# Altium footprint library Connectors THD.PcbLib: 631 footprints (part 8 of 46) (continued)
## AXON_ND2A225SCBRPG1 [mm] "AXON Nano-D 2 Row Right Angle PCB Receptacle With Threaded Hole #0-80 UNF" (continued)
Mechanical 14:
  circle w0.3: c-5.408,0.478 r0.15
  circle w0.1: c5.969,-1.448 r0.596
  circle w0.1: c-5.968,-1.448 r0.596
  circle w0.1: c-5.968,-3.178 r0.35
  circle w0.1: c-5.968,-3.178 r0.175
  circle w0.1: c5.969,-3.178 r0.35
  circle w0.1: c5.969,-3.178 r0.175
  lines w0.1: -4.699,-3.148 -4.699,2.662 ; -4.699,-0.128 -7.304,-0.128 -7.304,-8.868 7.306,-8.868 7.306,-0.128 4.701,-0.128 ; 4.706,-3.148 4.701,2.662 ; -4.699,2.662 4.701,2.662 ; -4.699,2.662 -4.704,-3.148 4.701,-3.148 4.701,2.662 ; -4.699,2.662 4.701,2.662
3D body: height 3.56, standoff -2.77, extent -7.304,-8.868 7.306,2.662

## BELFUSE_0826-1G1T-43-F [mm] "1 Port, Green/Green LEDs, RJ45 10/100/1000 Gigabit Ethernet, MagJack Connector Module"
height 13.61
pads (20):
  round 1.6 hole 0.9: 1(-5.08,1.27) 2(-3.048,1.27) 3(-1.016,1.27) 4(1.016,1.27) 5(3.048,1.27) 6(5.08,1.27) 7(-6.096,-1.27) 8(-4.064,-1.27) 9(-2.032,-1.27) 10(2.032,-1.27) 11(4.064,-1.27) 12(6.096,-1.27)
  round 1.8 hole 1.1: 13(-6.096,-3.81) 14(-3.556,-3.81) 15(3.556,-3.81) 16(6.096,-3.81)
  round 2.3 hole 1.6: 17(-8.065,19.685) 18(8.065,19.685)
  round 1 hole 3.2 unplated mask+1.1: 19(-6.35,16.51) 20(6.35,16.51)
Top Overlay:
  lines w0.2: -8.924,20.975 cw(c3.316,22.785) -8.15,27.435 ; -8.642,21.124 cw(c3.316,22.785) -8.15,26.565 ; -8.15,15.638 -8.15,-2.765 -7.95,-2.765 ; -8.15,17.382 -8.15,18.137 ; -8.15,21.233 -8.15,27.435 ; -7.325,-4.465 -7.95,-4.465 -7.95,-2.765 ; -7.325,-2.765 -7.95,-2.765 ; -6.826,-5.065 -2.826,-5.065 ; -6.5,27.435 cw(c-6,27.435) -6,27.935 -4.5,27.935 cw(c-4.5,27.435) -4,27.435 ; -6.3,27.435 -6.12,20.222 ccw(c-4.8,20.222) -3.48,20.222 -3.3,27.435 ; -5.8,27.435 -5.619,20.222 ccw(c-4.8,20.222) -3.981,20.201 -3.8,27.435 ; -2.4,-4.465 2.4,-4.465 ; -2.4,-2.765 2.4,-2.765 ; 2.826,-5.065 6.826,-5.065 ; 3.3,27.435 3.48,20.222 ccw(c4.8,20.222) 6.12,20.222 6.3,27.435 ; 3.8,27.435 3.981,20.201 ccw(c4.8,20.222) 5.619,20.222 5.8,27.435 ; 4,27.435 cw(c4.5,27.435) 4.5,27.935 6,27.935 cw(c6,27.435) 6.5,27.435 ; 7.325,-4.465 7.95,-4.465 7.95,-2.765 ; 7.325,-2.765 7.95,-2.765 ; 8.15,15.638 8.15,-2.765 7.95,-2.765 ; 8.15,17.382 8.15,18.137 ; 8.15,21.233 8.15,27.435 ; 8.15,26.565 cw(c-3.316,22.785) 8.642,21.124 ; 8.924,20.975 ccw(c-3.316,22.785) 8.15,27.435 ; -8.15,27.435 8.15,27.435
Mechanical 8:
  circle w0.1: c6.096,-1.27 r0.45
  circle w0.1: c-6.096,-1.27 r0.45
  circle w0.1: c6.096,-3.81 r0.55
  circle w0.1: c-6.096,-3.81 r0.55
  circle w0.1: c-5.08,1.27 r0.45
  circle w0.1: c5.08,1.27 r0.45
  circle w0.1: c6.35,16.51 r1.6
  circle w0.1: c-6.35,16.51 r1.6
  circle w0.1: c-8.065,19.685 r0.8
  circle w0.1: c8.065,19.685 r0.8
  lines w0.1: -8.565,19.685 -8.065,19.685 ; -8.065,19.185 -8.065,19.685 ; -8.065,20.185 -8.065,19.685 ; -7.565,19.685 -8.065,19.685 ; -6.85,16.51 -6.35,16.51 ; -6.596,-3.81 -6.096,-3.81 ; -6.596,-1.27 -6.096,-1.27 ; -6.35,16.01 -6.35,16.51 ; -6.35,17.01 -6.35,16.51 ; -6.096,-4.31 -6.096,-3.81 ; -6.096,-3.31 -6.096,-3.81 ; -6.096,-1.77 -6.096,-1.27 ; -6.096,-0.77 -6.096,-1.27 ; -5.85,16.51 -6.35,16.51 ; -5.596,-3.81 -6.096,-3.81 ; -5.596,-1.27 -6.096,-1.27 ; -5.58,1.27 -5.08,1.27 ; -5.08,0.77 -5.08,1.27 ; -5.08,1.77 -5.08,1.27 ; -4.58,1.27 -5.08,1.27 ; -4.564,-1.27 -4.064,-1.27 ; -4.064,-1.77 -4.064,-1.27 ; -4.064,-0.77 -4.064,-1.27 ; -4.056,-3.81 -3.556,-3.81 ; -3.564,-1.27 -4.064,-1.27 ; -3.556,-4.31 -3.556,-3.81 ; -3.556,-3.31 -3.556,-3.81 ; -3.548,1.27 -3.048,1.27 ; -3.056,-3.81 -3.556,-3.81 ; -3.048,0.77 -3.048,1.27 ; -3.048,1.77 -3.048,1.27 ; -2.548,1.27 -3.048,1.27 ; -2.532,-1.27 -2.032,-1.27 ; -2.032,-1.77 -2.032,-1.27 ; -2.032,-0.77 -2.032,-1.27 ; -1.532,-1.27 -2.032,-1.27 ; -1.516,1.27 -1.016,1.27 ; -1.016,0.77 -1.016,1.27 ; -1.016,1.77 -1.016,1.27 ; -0.516,1.27 -1.016,1.27 ; -0.5,0 0,0 ; 0,-0.5 0,0 ; 0,0.5 0,0 ; 0.5,0 0,0 ; 0.516,1.27 1.016,1.27 ; 1.016,0.77 1.016,1.27 ; 1.016,1.77 1.016,1.27 ; 1.516,1.27 1.016,1.27 ; 1.532,-1.27 2.032,-1.27 ; 2.032,-1.77 2.032,-1.27 ; 2.032,-0.77 2.032,-1.27 ; 2.532,-1.27 2.032,-1.27 ; 2.548,1.27 3.048,1.27 ; 3.048,0.77 3.048,1.27 ; 3.048,1.77 3.048,1.27 ; 3.056,-3.81 3.556,-3.81 ; 3.548,1.27 3.048,1.27 ; 3.556,-4.31 3.556,-3.81 ; 3.556,-3.31 3.556,-3.81 ; 3.564,-1.27 4.064,-1.27 ; 4.056,-3.81 3.556,-3.81 ; 4.064,-1.77 4.064,-1.27 ; 4.064,-0.77 4.064,-1.27 ; 4.564,-1.27 4.064,-1.27 ; 4.58,1.27 5.08,1.27 ; 5.08,0.77 5.08,1.27 ; 5.08,1.77 5.08,1.27 ; 5.58,1.27 5.08,1.27 ; 5.596,-3.81 6.096,-3.81 ; 5.596,-1.27 6.096,-1.27 ; 5.85,16.51 6.35,16.51 ; 6.096,-4.31 6.096,-3.81 ; 6.096,-3.31 6.096,-3.81 ; 6.096,-1.77 6.096,-1.27 ; 6.096,-0.77 6.096,-1.27 ; 6.35,16.01 6.35,16.51 ; 6.35,17.01 6.35,16.51 ; 6.596,-3.81 6.096,-3.81 ; 6.596,-1.27 6.096,-1.27 ; 6.85,16.51 6.35,16.51 ; 7.565,19.685 8.065,19.685 ; 8.065,19.185 8.065,19.685 ; 8.065,20.185 8.065,19.685 ; 8.565,19.685 8.065,19.685
Mechanical 14:
  lines w0.1: -8.15,26.565 ccw(c3.316,22.785) -8.306,19.516 -8.595,19.435 cw(c3.316,22.785) -8.15,27.435 ; -7.95,-2.765 -7.95,-4.465 -6.826,-4.465 ; -6.826,-2.765 -6.826,-5.065 -2.826,-5.065 -2.826,-2.765 ; -6.5,27.435 cw(c-6,27.435) -6,27.935 -4.5,27.935 cw(c-4.5,27.435) -4,27.435 ; -6.3,27.435 -6.12,20.222 ccw(c-4.8,20.222) -3.48,20.222 -3.3,27.435 ; -5.8,27.435 -5.619,20.222 ccw(c-4.8,20.222) -3.981,20.201 -3.8,27.435 ; -2.826,-4.465 2.826,-4.465 ; -2.826,-3.865 2.826,-3.865 ; 2.826,-2.765 2.826,-5.065 6.826,-5.065 6.826,-2.765 ; 3.3,27.435 3.48,20.222 ccw(c4.8,20.222) 6.12,20.222 6.3,27.435 ; 3.8,27.435 3.981,20.201 ccw(c4.8,20.222) 5.619,20.222 5.8,27.435 ; 4,27.435 cw(c4.5,27.435) 4.5,27.935 6,27.935 cw(c6,27.435) 6.5,27.435 ; 6.826,-4.465 7.95,-4.465 7.95,-2.765 ; 8.15,26.565 cw(c-3.316,22.785) 8.306,19.516 8.595,19.435 ccw(c-3.316,22.785) 8.15,27.435 ; -8.15,27.435 8.15,27.435 ; -8.15,27.435 -8.15,-2.765 8.15,-2.765 8.15,27.435
3D body: height 14.31, standoff -3.68, extent -9.057,-5.065 9.057,27.935

## BELFUSE_0826-1X1T-GJ-F [mm] "1 Port, Orange Green/Yellow LEDs, RJ45 10/100BaseT, PoE, Ethernet MagJack® Connector Module"
height 13.61
pads (18):
  round 1.6 hole 0.9: 4(1.016,1.27) 5(3.048,1.27) 6(5.08,1.27) 10(2.032,-1.27) 11(4.064,-1.27) 12(6.096,-1.27)
  round 1.2 hole 0.6: 13(-5.59,8.38) 14(5.59,8.38) 15(-5.59,9.87) 16(5.59,9.87)
  round 1.8 hole 1.1: 17(-6.096,-3.81) 18(-3.556,-3.81) 19(3.556,-3.81) 20(6.096,-3.81)
  round 2.3 hole 1.6: 21(-8.065,19.685) 22(8.065,19.685)
  round 1 hole 3.25 unplated mask+1.125: 23(-6.35,16.51) 24(6.35,16.51)
Top Overlay:
  lines w0.2: -8.924,20.975 cw(c3.316,22.785) -8.15,27.435 ; -8.642,21.124 cw(c3.316,22.785) -8.15,26.565 ; -8.15,15.638 -8.15,-2.765 -6.685,-2.765 ; -8.15,17.382 -8.15,18.137 ; -8.15,21.233 -8.15,27.435 ; -7.95,-2.765 -7.95,-4.465 -7.1,-4.465 ; -6.826,-4.762 -6.826,-5.065 -2.826,-5.065 -2.826,-4.763 ; -6.5,27.435 cw(c-6,27.435) -6,27.935 -4.5,27.935 cw(c-4.5,27.435) -4,27.435 ; -6.3,27.435 -6.12,20.222 ccw(c-4.8,20.222) -3.48,20.222 -3.3,27.435 ; -5.8,27.435 -5.619,20.222 ccw(c-4.8,20.222) -3.981,20.201 -3.8,27.435 ; -5.505,-2.765 -4.145,-2.765 ; -2.965,-2.765 2.965,-2.765 ; -2.549,-4.465 2.55,-4.465 ; 2.826,-4.763 2.826,-5.065 6.826,-5.065 6.826,-4.762 ; 3.3,27.435 3.48,20.222 ccw(c4.8,20.222) 6.12,20.222 6.3,27.435 ; 3.8,27.435 3.981,20.201 ccw(c4.8,20.222) 5.619,20.222 5.8,27.435 ; 4,27.435 cw(c4.5,27.435) 4.5,27.935 6,27.935 cw(c6,27.435) 6.5,27.435 ; 4.145,-2.765 5.505,-2.765 ; 6.685,-2.765 8.15,-2.765 8.15,15.638 ; 7.101,-4.465 7.95,-4.465 7.95,-2.765 ; 8.15,17.382 8.15,18.137 ; 8.15,21.233 8.15,27.435 ; 8.15,26.565 cw(c-3.316,22.785) 8.642,21.124 ; 8.924,20.975 ccw(c-3.316,22.785) 8.15,27.435 ; -8.15,27.435 8.15,27.435
Mechanical 7:
  lines w0.1: -8.915,-3.56 -8.915,2.91 -6.555,2.91 -6.555,-3.56 -8.915,-3.56 ; -8.915,20.52 -8.915,27.43 8.915,27.43 8.915,20.52 5.995,20.52 5.995,24.38 -5.995,24.38 -5.995,20.52 -8.915,20.52 ; 6.555,-3.56 6.555,2.91 8.915,2.91 8.915,-3.56 6.555,-3.56
Mechanical 8:
  circle w0.1: c5.59,9.87 r0.35
  circle w0.1: c5.59,9.87 r0.6
  circle w0.1: c5.59,8.38 r0.35
  circle w0.1: c5.59,8.38 r0.6
  circle w0.1: c6.35,16.51 r1.625
  circle w0.1: c-6.35,16.51 r1.625
  circle w0.1: c-8.065,19.68 r0.785
  circle w0.1: c8.065,19.68 r0.785
  circle w0.1: c6.095,-3.81 r0.9
  circle w0.1: c-6.095,-3.81 r0.9
  circle w0.1: c-3.555,-3.81 r0.9
  circle w0.1: c3.555,-3.81 r0.9
  circle w0.1: c6.095,-1.27 r0.9
  circle w0.1: c5.075,1.27 r0.9
  circle w0.1: c-5.59,9.87 r0.6
  circle w0.1: c-5.59,8.38 r0.6
  circle w0.1: c-6.095,-3.81 r0.5
  circle w0.1: c6.095,-3.81 r0.5
  circle w0.1: c6.095,-1.27 r0.45
  circle w0.1: c-5.59,9.87 r0.35
  circle w0.1: c-5.59,8.38 r0.35
  lines w0.1: -8.565,19.68 -8.065,19.68 ; -8.065,19.18 -8.065,19.68 ; -8.065,20.18 -8.065,19.68 ; -7.565,19.68 -8.065,19.68 ; -6.85,16.51 -6.35,16.51 ; -6.595,-3.81 -6.095,-3.81 ; -6.595,-1.27 -6.095,-1.27 ; -6.35,16.01 -6.35,16.51 ; -6.35,17.01 -6.35,16.51 ; -6.095,-4.31 -6.095,-3.81 ; -6.095,-3.31 -6.095,-3.81 ; -6.095,-1.77 -6.095,-1.27 ; -6.095,-0.77 -6.095,-1.27 ; -6.09,8.38 -5.59,8.38 ; -6.09,9.87 -5.59,9.87 ; -5.85,16.51 -6.35,16.51 ; -5.595,-3.81 -6.095,-3.81 ; -5.595,-1.27 -6.095,-1.27 ; -5.59,7.88 -5.59,8.38 ; -5.59,8.88 -5.59,8.38 ; -5.59,9.37 -5.59,9.87 ; -5.59,10.37 -5.59,9.87 ; -5.575,1.27 -5.075,1.27 ; -5.09,8.38 -5.59,8.38 ; -5.09,9.87 -5.59,9.87 ; -5.075,0.77 -5.075,1.27 ; -5.075,1.77 -5.075,1.27 ; -4.575,1.27 -5.075,1.27 ; -4.565,-1.27 -4.065,-1.27 ; -4.065,-1.77 -4.065,-1.27 ; -4.065,-0.77 -4.065,-1.27 ; -4.055,-3.81 -3.555,-3.81 ; -3.565,-1.27 -4.065,-1.27 ; -3.555,-4.31 -3.555,-3.81 ; -3.555,-3.31 -3.555,-3.81 ; -3.545,1.27 -3.045,1.27 ; -3.055,-3.81 -3.555,-3.81 ; -3.045,0.77 -3.045,1.27 ; -3.045,1.77 -3.045,1.27 ; -2.545,1.27 -3.045,1.27 ; -2.535,-1.27 -2.035,-1.27 ; -2.035,-1.77 -2.035,-1.27 ; -2.035,-0.77 -2.035,-1.27 ; -1.535,-1.27 -2.035,-1.27 ; -1.515,1.27 -1.015,1.27 ; -1.015,0.77 -1.015,1.27 ; -1.015,1.77 -1.015,1.27 ; -0.515,1.27 -1.015,1.27 ; -0.354,-0.354 0,0 ; -0.354,0.354 0,0 ; 0.354,-0.354 0,0 ; 0.354,0.354 0,0 ; 0.515,1.27 1.015,1.27 ; 1.015,0.77 1.015,1.27 ; 1.015,1.77 1.015,1.27 ; 1.515,1.27 1.015,1.27 ; 1.535,-1.27 2.035,-1.27 ; 2.035,-1.77 2.035,-1.27 ; 2.035,-0.77 2.035,-1.27 ; 2.535,-1.27 2.035,-1.27 ; 2.545,1.27 3.045,1.27 ; 3.045,0.77 3.045,1.27 ; 3.045,1.77 3.045,1.27 ; 3.055,-3.81 3.555,-3.81 ; 3.545,1.27 3.045,1.27 ; 3.555,-4.31 3.555,-3.81 ; 3.555,-3.31 3.555,-3.81 ; 3.565,-1.27 4.065,-1.27 ; 4.055,-3.81 3.555,-3.81 ; 4.065,-1.77 4.065,-1.27 ; 4.065,-0.77 4.065,-1.27 ; 4.565,-1.27 4.065,-1.27 ; 4.575,1.27 5.075,1.27 ; 5.075,0.77 5.075,1.27 ; 5.075,1.77 5.075,1.27 ; 5.09,8.38 5.59,8.38 ; 5.09,9.87 5.59,9.87 ; 5.575,1.27 5.075,1.27 ; 5.59,7.88 5.59,8.38 ; 5.59,8.88 5.59,8.38 ; 5.59,9.37 5.59,9.87 ; 5.59,10.37 5.59,9.87 ; 5.595,-3.81 6.095,-3.81 ; 5.595,-1.27 6.095,-1.27 ; 5.85,16.51 6.35,16.51 ; 6.09,8.38 5.59,8.38 ; 6.09,9.87 5.59,9.87 ; 6.095,-4.31 6.095,-3.81 ; 6.095,-3.31 6.095,-3.81 ; 6.095,-1.77 6.095,-1.27 ; 6.095,-0.77 6.095,-1.27 ; 6.35,16.01 6.35,16.51 ; 6.35,17.01 6.35,16.51 ; 6.595,-3.81 6.095,-3.81 ; 6.595,-1.27 6.095,-1.27 ; 6.85,16.51 6.35,16.51 ; 7.565,19.68 8.065,19.68 ; 8.065,19.18 8.065,19.68 ; 8.065,20.18 8.065,19.68 ; 8.565,19.68 8.065,19.68
Mechanical 14:
  lines w0.1: -8.15,26.565 ccw(c3.316,22.785) -8.306,19.516 -8.595,19.435 cw(c3.316,22.785) -8.15,27.435 ; -7.95,-2.765 -7.95,-4.465 -6.826,-4.465 ; -6.826,-2.765 -6.826,-5.065 -2.826,-5.065 -2.826,-2.765 ; -6.5,27.435 cw(c-6,27.435) -6,27.935 -4.5,27.935 cw(c-4.5,27.435) -4,27.435 ; -6.3,27.435 -6.12,20.222 ccw(c-4.8,20.222) -3.48,20.222 -3.3,27.435 ; -5.8,27.435 -5.619,20.222 ccw(c-4.8,20.222) -3.981,20.201 -3.8,27.435 ; -2.826,-4.465 2.826,-4.465 ; -2.826,-3.865 2.826,-3.865 ; 2.826,-2.765 2.826,-5.065 6.826,-5.065 6.826,-2.765 ; 3.3,27.435 3.48,20.222 ccw(c4.8,20.222) 6.12,20.222 6.3,27.435 ; 3.8,27.435 3.981,20.201 ccw(c4.8,20.222) 5.619,20.222 5.8,27.435 ; 4,27.435 cw(c4.5,27.435) 4.5,27.935 6,27.935 cw(c6,27.435) 6.5,27.435 ; 6.826,-4.465 7.95,-4.465 7.95,-2.765 ; 8.15,26.565 cw(c-3.316,22.785) 8.306,19.516 8.595,19.435 ccw(c-3.316,22.785) 8.15,27.435 ; -8.15,27.435 -8.15,-2.765 8.15,-2.765 8.15,27.435 ; -8.15,27.435 8.15,27.435
3D body: height 14.51, standoff -3.47, extent -9.055,-5.065 9.055,27.935

## BELFUSE_L829-1J1T-43 [mm] "1 Port, Green/Green LEDs, Gigabit Ethernet, MagJack Connector Module"
height 11.3
pads (21):
  round 1.6 hole 0.9: 1(-5.08,1.27) 2(-3.048,1.27) 3(-1.016,1.27) 4(1.016,1.27) 5(3.048,1.27) 6(5.08,1.27) 7(-6.096,-1.27) 8(-4.064,-1.27) 9(-2.032,-1.27) 10(2.032,-1.27) 11(4.064,-1.27) 12(6.096,-1.27)
  round 2 hole 1.3: 13(-7.52,14.22) 14(-7.52,16.76) 15(7.52,11.68) 16(7.52,14.22) 17(7.52,16.76)
  round 2.3 hole 1.6: 18(-8.79,7.87) 19(8.79,7.87)
  round 1 hole 3.2 unplated mask+1.1: 20(-4.825,7.87) 21(4.825,7.87)
Top Overlay:
  lines w0.2: -8.79,6.47 -8.79,-3.06 8.79,-3.06 8.79,6.47 ; -8.79,9.27 -8.79,21.07 ; -8.79,20.2 ccw(c2.676,16.42) -8.923,13.07 -9.235,13.07 cw(c2.676,16.42) -8.79,21.07 ; -6.147,13.72 -6.147,21.07 ; -6.147,13.721 ccw(c-5.097,13.72) -4.047,13.719 -4.047,21.07 ; -5.7,21.07 -5.503,13.177 ; -5.466,13.157 ccw(c-5.097,13.89) -4.692,13.177 -4.494,21.07 ; 4.047,13.72 4.047,21.07 ; 4.047,13.721 ccw(c5.097,13.72) 6.147,13.719 6.147,21.07 ; 4.494,21.07 4.692,13.177 ; 4.728,13.157 ccw(c5.097,13.89) 5.503,13.177 5.7,21.07 ; 8.79,9.27 8.79,21.07 ; 8.79,20.2 cw(c-2.676,16.42) 8.923,13.07 9.235,13.07 ccw(c-2.676,16.42) 8.79,21.07 ; -8.79,21.07 8.79,21.07
Mechanical 8:
  lines w0.1: -9.29,7.87 -8.79,7.87 ; -8.79,7.37 -8.79,7.87 ; -8.79,8.37 -8.79,7.87 ; -8.29,7.87 -8.79,7.87 ; -8.02,14.22 -7.52,14.22 ; -8.02,16.76 -7.52,16.76 ; -7.52,13.72 -7.52,14.22 ; -7.52,14.72 -7.52,14.22 ; -7.52,16.26 -7.52,16.76 ; -7.52,17.26 -7.52,16.76 ; -7.02,14.22 -7.52,14.22 ; -7.02,16.76 -7.52,16.76 ; -6.596,-1.27 -6.096,-1.27 ; -6.096,-1.77 -6.096,-1.27 ; -6.096,-0.77 -6.096,-1.27 ; -5.596,-1.27 -6.096,-1.27 ; -5.58,1.27 -5.08,1.27 ; -5.325,7.87 -4.825,7.87 ; -5.08,0.77 -5.08,1.27 ; -5.08,1.77 -5.08,1.27 ; -4.825,7.37 -4.825,7.87 ; -4.825,8.37 -4.825,7.87 ; -4.58,1.27 -5.08,1.27 ; -4.564,-1.27 -4.064,-1.27 ; -4.325,7.87 -4.825,7.87 ; -4.064,-1.77 -4.064,-1.27 ; -4.064,-0.77 -4.064,-1.27 ; -3.564,-1.27 -4.064,-1.27 ; -3.548,1.27 -3.048,1.27 ; -3.048,0.77 -3.048,1.27 ; -3.048,1.77 -3.048,1.27 ; -2.548,1.27 -3.048,1.27 ; -2.532,-1.27 -2.032,-1.27 ; -2.032,-1.77 -2.032,-1.27 ; -2.032,-0.77 -2.032,-1.27 ; -1.532,-1.27 -2.032,-1.27 ; -1.516,1.27 -1.016,1.27 ; -1.016,0.77 -1.016,1.27 ; -1.016,1.77 -1.016,1.27 ; -0.516,1.27 -1.016,1.27 ; -0.5,0 0,0 ; 0,-0.5 0,0 ; 0,0.5 0,0 ; 0.5,0 0,0 ; 0.516,1.27 1.016,1.27 ; 1.016,0.77 1.016,1.27 ; 1.016,1.77 1.016,1.27 ; 1.516,1.27 1.016,1.27 ; 1.532,-1.27 2.032,-1.27 ; 2.032,-1.77 2.032,-1.27 ; 2.032,-0.77 2.032,-1.27 ; 2.532,-1.27 2.032,-1.27 ; 2.548,1.27 3.048,1.27 ; 3.048,0.77 3.048,1.27 ; 3.048,1.77 3.048,1.27 ; 3.548,1.27 3.048,1.27 ; 3.564,-1.27 4.064,-1.27 ; 4.064,-1.77 4.064,-1.27 ; 4.064,-0.77 4.064,-1.27 ; 4.325,7.87 4.825,7.87 ; 4.564,-1.27 4.064,-1.27 ; 4.58,1.27 5.08,1.27 ; 4.825,7.37 4.825,7.87 ; 4.825,8.37 4.825,7.87 ; 5.08,0.77 5.08,1.27 ; 5.08,1.77 5.08,1.27 ; 5.325,7.87 4.825,7.87 ; 5.58,1.27 5.08,1.27 ; 5.596,-1.27 6.096,-1.27 ; 6.096,-1.77 6.096,-1.27 ; 6.096,-0.77 6.096,-1.27 ; 6.596,-1.27 6.096,-1.27 ; 7.02,11.68 7.52,11.68 ; 7.02,14.22 7.52,14.22 ; 7.02,16.76 7.52,16.76 ; 7.52,11.18 7.52,11.68 ; 7.52,12.18 7.52,11.68 ; 7.52,13.72 7.52,14.22 ; 7.52,14.72 7.52,14.22 ; 7.52,16.26 7.52,16.76 ; 7.52,17.26 7.52,16.76 ; 8.02,11.68 7.52,11.68 ; 8.02,14.22 7.52,14.22 ; 8.02,16.76 7.52,16.76 ; 8.29,7.87 8.79,7.87 ; 8.79,7.37 8.79,7.87 ; 8.79,8.37 8.79,7.87 ; 9.29,7.87 8.79,7.87
Mechanical 14:
  lines w0.1: -8.79,20.2 ccw(c2.676,16.42) -8.923,13.07 -9.235,13.07 cw(c2.676,16.42) -8.79,21.07 ; -6.147,13.72 -6.147,21.07 ; -6.147,13.721 ccw(c-5.097,13.72) -4.047,13.719 -4.047,21.07 ; -5.7,21.07 -5.503,13.177 ; -5.466,13.157 ccw(c-5.097,13.89) -4.692,13.177 -4.494,21.07 ; 4.047,13.72 4.047,21.07 ; 4.047,13.721 ccw(c5.097,13.72) 6.147,13.719 6.147,21.07 ; 4.494,21.07 4.692,13.177 ; 4.728,13.157 ccw(c5.097,13.89) 5.503,13.177 5.7,21.07 ; 8.79,20.2 cw(c-2.676,16.42) 8.923,13.07 9.235,13.07 ccw(c-2.676,16.42) 8.79,21.07 ; -8.79,21.07 -8.79,-3.06 8.79,-3.06 8.79,21.07 ; -8.79,21.07 8.79,21.07
3D body: height 12.2, standoff -3.3, extent -9.694,-3.06 9.694,21.07

## BELFUSE_SI-16001-F [mm] "1 Port, Without LED, RJ45 10/100Base-T Ethernet Vertical Connector Module With Integrated Magnetics"
height 17.27
pads (12):
  round 1.6 hole 0.9: 1(-4.445,-1.27) 2(-3.175,1.27) 3(-1.905,-1.27) 4(-0.635,1.27) 5(0.635,-1.27) 6(1.905,1.27) 7(3.175,-1.27) 8(4.445,1.27)
  round 2.3 hole 1.6: 9(-7.875,-3.73) 10(7.875,-3.73)
  round 1 hole 3.2 unplated mask+1.1: M1(-5.715,-7.62) M2(5.715,-7.62)
Top Overlay:
  lines w0.2: -8.13,-5.259 -8.13,-14.4 8.13,-14.4 8.13,-5.259 ; -8.13,-2.201 -8.13,2.62 8.13,2.62 8.13,-2.201 ; -6.2,-9.56 -6.2,-10.87 ccw(c-6,-10.87) -6,-11.07 -3.595,-11.07 cw(c-3.595,-11.27) -3.395,-11.27 -3.395,-12.67 ccw(c-3.195,-12.67) -3.195,-12.87 -2.475,-12.87 cw(c-2.475,-13.07) -2.275,-13.07 -2.275,-14.05 2.275,-14.05 2.275,-13.07 cw(c2.475,-13.07) 2.475,-12.87 3.195,-12.87 ccw(c3.195,-12.67) 3.395,-12.67 3.395,-11.27 cw(c3.595,-11.27) 3.595,-11.07 6,-11.07 ccw(c6,-10.87) 6.2,-10.87 6.2,-9.56 ; -6.2,-5.68 -6.2,-3.96 cw(c-6,-3.96) -6,-3.76 6,-3.76 cw(c6,-3.96) 6.2,-3.96 6.2,-5.68 ; -5.955,-9.76 -3.15,-9.76 ; -5.955,-9.606 -5.955,-10.9 -3.15,-10.9 ; -5.955,-5.634 -5.955,-4.07 5.955,-4.07 5.955,-5.634 ; -3.78,-4.07 -3.78,-7.304 -3.32,-7.304 -3.32,-4.07 ; -2.764,-4.07 -2.764,-7.304 -2.304,-7.304 -2.304,-4.07 ; -1.748,-4.07 -1.748,-7.304 -1.288,-7.304 -1.288,-4.07 ; -0.732,-4.07 -0.732,-7.304 -0.272,-7.304 -0.272,-4.07 ; 0.284,-4.07 0.284,-7.304 0.744,-7.304 0.744,-4.07 ; 1.3,-4.07 1.3,-7.304 1.76,-7.304 1.76,-4.07 ; 2.316,-4.07 2.316,-7.304 2.776,-7.304 2.776,-4.07 ; 3.15,-10.9 5.955,-10.9 5.955,-9.606 ; 3.15,-9.76 5.955,-9.76 ; 3.332,-4.07 3.332,-7.304 3.792,-7.304 3.792,-4.07 ; -3.15,-12.57 -3.15,-8.49 3.15,-8.49 3.15,-12.57 2.03,-12.57 2.03,-13.87 -2.03,-13.87 -2.03,-12.57 -3.15,-12.57
Mechanical 8:
  lines w0.1: -8.375,-3.73 -7.875,-3.73 ; -7.875,-4.23 -7.875,-3.73 ; -7.875,-3.23 -7.875,-3.73 ; -7.375,-3.73 -7.875,-3.73 ; -6.215,-7.62 -5.715,-7.62 ; -5.715,-8.12 -5.715,-7.62 ; -5.715,-7.12 -5.715,-7.62 ; -5.215,-7.62 -5.715,-7.62 ; -4.945,-1.27 -4.445,-1.27 ; -4.445,-1.77 -4.445,-1.27 ; -4.445,-0.77 -4.445,-1.27 ; -3.945,-1.27 -4.445,-1.27 ; -3.675,1.27 -3.175,1.27 ; -3.175,0.77 -3.175,1.27 ; -3.175,1.77 -3.175,1.27 ; -2.675,1.27 -3.175,1.27 ; -2.405,-1.27 -1.905,-1.27 ; -1.905,-1.77 -1.905,-1.27 ; -1.905,-0.77 -1.905,-1.27 ; -1.405,-1.27 -1.905,-1.27 ; -1.135,1.27 -0.635,1.27 ; -0.635,0.77 -0.635,1.27 ; -0.635,1.77 -0.635,1.27 ; -0.5,0 0,0 ; -0.135,1.27 -0.635,1.27 ; 0,-0.5 0,0 ; 0,0.5 0,0 ; 0.135,-1.27 0.635,-1.27 ; 0.5,0 0,0 ; 0.635,-1.77 0.635,-1.27 ; 0.635,-0.77 0.635,-1.27 ; 1.135,-1.27 0.635,-1.27 ; 1.405,1.27 1.905,1.27 ; 1.905,0.77 1.905,1.27 ; 1.905,1.77 1.905,1.27 ; 2.405,1.27 1.905,1.27 ; 2.675,-1.27 3.175,-1.27 ; 3.175,-1.77 3.175,-1.27 ; 3.175,-0.77 3.175,-1.27 ; 3.675,-1.27 3.175,-1.27 ; 3.945,1.27 4.445,1.27 ; 4.445,0.77 4.445,1.27 ; 4.445,1.77 4.445,1.27 ; 4.945,1.27 4.445,1.27 ; 5.215,-7.62 5.715,-7.62 ; 5.715,-8.12 5.715,-7.62 ; 5.715,-7.12 5.715,-7.62 ; 6.215,-7.62 5.715,-7.62 ; 7.375,-3.73 7.875,-3.73 ; 7.875,-4.23 7.875,-3.73 ; 7.875,-3.23 7.875,-3.73 ; 8.375,-3.73 7.875,-3.73
Mechanical 14:
  lines w0.1: -6.635,-8.5 -5.449,-8.5 -5.449,-6.47 -6.635,-6.47 ; -5.955,-9.76 -3.15,-9.76 ; -5.955,-8.5 -5.955,-10.9 -3.15,-10.9 ; -5.955,-6.47 -5.955,-4.07 5.955,-4.07 5.955,-6.47 ; -3.78,-4.07 -3.78,-7.304 -3.32,-7.304 -3.32,-4.07 ; -2.764,-4.07 -2.764,-7.304 -2.304,-7.304 -2.304,-4.07 ; -1.748,-4.07 -1.748,-7.304 -1.288,-7.304 -1.288,-4.07 ; -0.732,-4.07 -0.732,-7.304 -0.272,-7.304 -0.272,-4.07 ; 0.284,-4.07 0.284,-7.304 0.744,-7.304 0.744,-4.07 ; 1.3,-4.07 1.3,-7.304 1.76,-7.304 1.76,-4.07 ; 2.316,-4.07 2.316,-7.304 2.776,-7.304 2.776,-4.07 ; 3.15,-10.9 5.955,-10.9 5.955,-8.5 ; 3.15,-9.76 5.954,-9.76 ; 3.332,-4.07 3.332,-7.304 3.792,-7.304 3.792,-4.07 ; 6.635,-8.5 5.48,-8.5 5.48,-6.47 6.635,-6.47 ; -8.13,-14.4 -8.13,2.62 8.13,2.62 8.13,-14.4 -8.13,-14.4 ; -6.635,-9.01 -6.2,-9.01 -6.2,-10.87 ccw(c-6,-10.87) -6,-11.07 -3.595,-11.07 cw(c-3.595,-11.27) -3.395,-11.27 -3.395,-12.67 ccw(c-3.195,-12.67) -3.195,-12.87 -2.475,-12.87 cw(c-2.475,-13.07) -2.275,-13.07 -2.275,-14.05 2.275,-14.05 2.275,-13.07 cw(c2.475,-13.07) 2.475,-12.87 3.195,-12.87 ccw(c3.195,-12.67) 3.395,-12.67 3.395,-11.27 cw(c3.595,-11.27) 3.595,-11.07 6,-11.07 ccw(c6,-10.87) 6.2,-10.87 6.2,-9.01 6.635,-9.01 6.635,-5.96 6.2,-5.96 6.2,-3.96 ccw(c6,-3.96) 6,-3.76 -6,-3.76 ccw(c-6,-3.96) -6.2,-3.96 -6.2,-5.96 -6.635,-5.96 -6.635,-9.01 ; -3.15,-12.57 -3.15,-8.49 3.15,-8.49 3.15,-12.57 2.03,-12.57 2.03,-13.87 -2.03,-13.87 -2.03,-12.57 -3.15,-12.57
3D body: height 17.02, standoff -4, extent -8.13,-14.4 8.13,2.62

## BULGIN_PX0580-PC-COL [mm] "10A 250Vac PC Flange Rear Mount Inlet IEC Connector"
height 32.1
pads (5):
  round 2.4 hole 1.7: 1(9.14,0) 2(0,0) 3(-9.14,0)
  round 5.5 hole 3.4: 4(-20,9.65) 4(20,9.65)
Top Overlay:
  lines w0.2: -24.9,15.95 24.9,15.95 ; -14.785,18.35 -14.785,21.35 14.785,21.35 14.785,18.35 ; -13.3,0.45 -10.727,0.45 ; -13.3,3.35 -22.4,3.35 cw(c-22.4,5.85) -24.9,5.85 -24.9,18.35 24.9,18.35 24.9,5.85 cw(c22.4,5.85) 22.4,3.35 13.3,3.35 ; -13.3,15.95 -13.3,-3.55 13.3,-3.55 13.3,15.95 ; -7.553,0.45 -1.587,0.45 ; -7.539,0.45 -7.539,15.95 ; -1,-2.257 1,-2.257 ; -0.7,-2.657 0.7,-2.657 ; -0.4,-3.057 0.3,-3.057 ; 0,-2.257 0,-1.657 ; 1.587,0.45 7.553,0.45 ; 7.539,0.45 7.539,15.95 ; 10.727,0.45 13.3,0.45
  text "N" at -9.602,-3.075 h1.5
  text "L" at 8.843,-3.075 h1.5
Mechanical 8:
  lines w0.1: -21,9.65 -20,9.65 ; -20,8.65 -20,9.65 ; -20,10.65 -20,9.65 ; -19,9.65 -20,9.65 ; -10.14,0 -9.14,0 ; -9.14,-1 -9.14,0 ; -9.14,1 -9.14,0 ; -8.14,0 -9.14,0 ; -1,0 0,0 ; 0,-1 0,0 ; 0,1 0,0 ; 1,0 0,0 ; 8.14,0 9.14,0 ; 9.14,-1 9.14,0 ; 9.14,1 9.14,0 ; 10.14,0 9.14,0 ; 19,9.65 20,9.65 ; 20,8.65 20,9.65 ; 20,10.65 20,9.65 ; 21,9.65 20,9.65
Mechanical 14:
  circle w0.1: c-20,9.65 r1.7
  circle w0.1: c20,9.65 r1.7
  lines w0.1: -24.9,15.95 24.9,15.95 ; -14.785,18.35 -14.785,21.35 14.785,21.35 14.785,18.35 ; -13.3,0.45 13.3,0.45 ; -13.3,3.35 -22.4,3.35 cw(c-22.4,5.85) -24.9,5.85 -24.9,18.35 24.9,18.35 24.9,5.85 cw(c22.4,5.85) 22.4,3.35 13.3,3.35 ; -13.3,15.95 -13.3,-3.55 13.3,-3.55 13.3,15.95 ; -7.539,0.45 -7.539,15.95 ; -1,-2.257 1,-2.257 ; -0.7,-2.657 0.7,-2.657 ; -0.4,-3.057 0.3,-3.057 ; 0,-2.257 0,-1.657 ; 7.539,0.45 7.539,15.95
  text "N" at -9.602,-3.075 h1.5
  text "L" at 8.843,-3.075 h1.5
3D body: height 27.8, standoff -3.6, extent -24.9,-3.55 24.9,21.35